# Altium schematic symbol library PCB-Tester-Board.SCHLIB: 118 symbols (part 1 of 2)
Pins are listed as number, name and electrical type; pins without a type are passive.

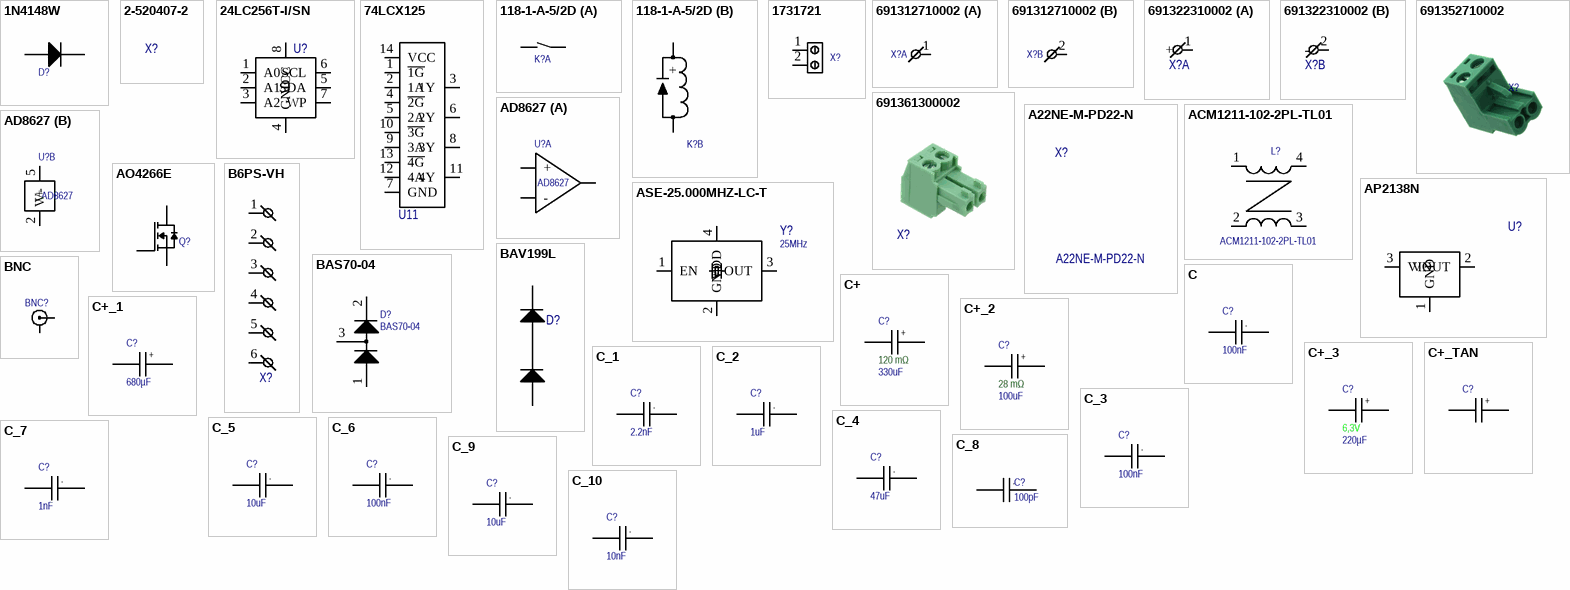
[diagram p0: symbols 1N4148W to C_10]

## 1N4148W
designator D?, comment D  (value not drawn)
DIODE SILICON 100V 2A SOD123; 07. Manufacturer  Part Number: 1N4148W; 11. RoHS: YES; ComponentLink1Description: Info; ComponentLink1URL: https://www.digikey.de/product-detail/en/nexperia-usa-inc/PMEG4050EP115/1727-5842-6-ND/2697559; ComponentLink2Description: DataSheet; ComponentLink2URL: https://assets.nexperia.com/documents/data-sheet/PMEG4050EP.pdf
footprint SOD123
pins: 1 A, 2 C

## 2-520407-2
designator X?, comment X  (value not drawn)
CONN QC RCPT 18-22AWG 0.250; 04. Manufacturer: TE Connectivity AMP Connectors; 07. Manufacturer  Part Number: 2-520407-2; 03. Unit Price: 0.36; 13. Created Date/Name: AUG 2018 / Hören; System: Connector; 01. Distributor: DigiKey; 02. Distributor Part Number: A27854-ND; 11. RoHS: YES; ComponentLink1Description: Info; ComponentLink1URL: https://www.digikey.de/products/de?keywords=2-520407-2; ComponentLink2Description: DataSheet; ComponentLink2URL: https://www.te.com/commerce/DocumentDelivery/DDEController?Action=srchrtrv&DocNm=520407&DocType=Customer+Drawing&DocLang=English

## 24LC256T-I/SN
designator U?, comment U  (value not drawn)
IC EEPROM 256K I2C 400KHZ 8SOIC; 04. Manufacturer: Microchip Technology; 07. Manufacturer  Part Number: 24LC256T-I/SN; 03. Unit Price: 0.71; 13. Created Date/Name: AUG 2018 / Hören; 01. Distributor: DigiKey; 02. Distributor Part Number: 24LC256T-I/SNDKR-ND; 11. RoHS: YES; ComponentLink1Description: Info; ComponentLink1URL: https://www.digikey.de/product-detail/en/microchip-technology/24LC256T-I-SN/24LC256T-I-SNDKR-ND/1850685; ComponentLink2Description: DataSheet; ComponentLink2URL: http://ww1.microchip.com/downloads/en/DeviceDoc/24AA256-24LC256-24FC256-Data-Sheet-20001203W.pdf; Package: SOIC8
footprint SOIC8 (R-8) (Generic 8 lead SOIC Narrow Body)
pins: 1 A0, 2 A1, 3 A2, 4 GND (power), 5 SDA, 6 SCL, 7 WP, 8 VCC (power)

## 74LCX125
designator U11, comment U  (value not drawn)
IC BUF NON-INVERT 3.6V 14TSSOP; 04. Manufacturer: STMicroelectronics; 07. Manufacturer  Part Number: 74LCX125YTTR; 01. Distributor: DigiKey; 02. Distributor Part Number: 497-13204-2-ND; 11. RoHS: YES; ComponentLink1Description: Info; ComponentLink2Description: DataSheet; Package: TSSOP14
footprint TSSOP14 (R-PDSO-G14)
pins: 1 ~{1G}, 2 1A, 3 1Y, 4 ~{2G}, 5 2A, 6 2Y, 7 GND, 8 3Y, 9 3A, 10 ~{3G}, 11 4Y, 12 4A, 13 ~{4G}, 14 VCC

## 118-1-A-5/2D
designator K?, comment K  (value not drawn)
5V Signal Relais, Normal Open; 04. Manufacturer: Pickering; 07. Manufacturer  Part Number: 118-1-A-5/2D; 03. Unit Price: 2.60; 05. Quantity: 1000; 06. Data Sheet: Pickering_series_118.pdf; 13. Created Date/Name: 20.12.17 S. Kaiser; Coil Resistance: 1500 Ohm; Max Carry Current: 1.2 A; Max Switch Current: 1A; Max Switch Voltage: 200V; Power Rating: 15W; 01. Distributor: Pickering; 02. Distributor Part Number: 118-1-A-5/2D; 09. Operating Temperature: -20°C ~ +85°C; 11. RoHS: 2011/65/EU; ComponentLink1Description: Info; ComponentLink1URL: http://www.pickeringrelay.com/; ComponentLink2Description: DataSheet; ComponentLink2URL: https://www.pickeringrelay.com/products/single-line-sil-series-111-119/single-line-sil-series-118/; Coil Voltage: 5V
footprint 118-1A (ATE Relay (NO))
part A pins: 3 CA, 4 CB
part B pins: 1 +, 2 -
1 alternate drawing of the same symbol

## 1731721
designator X?, comment X  (value not drawn)
TERM BLK 2P SIDE ENT 7.62MM PCB; 04. Manufacturer: Phoenix Contact; 07. Manufacturer  Part Number: 1731721; 03. Unit Price: 2.12; 13. Created Date/Name: JAN 2019 / Hören; System: Connector; 01. Distributor: DigiKey; 02. Distributor Part Number: 277-5849-ND; 11. RoHS: YES; ComponentLink1Description: Info; ComponentLink1URL: https://www.digikey.de/products/en?keywords=1731721; ComponentLink2Description: DataSheet; ComponentLink2URL: https://media.digikey.com/pdf/Data%20Sheets/Phoenix%20Contact%20PDFs/1731721.pdf
footprint 1731721 (TERM BLK 2P SIDE ENT 7.62MM PCB)
pins: 1, 2

## 691312710002
designator X?, comment X  (value not drawn)
TERM BLOCK HDR 2POS 90DEG 5MM; 04. Manufacturer: Würth Elektronik; 07. Manufacturer  Part Number: 691312710002; 03. Unit Price: 0.244; 13. Created Date/Name: ??? / Hören; System: Connector; 01. Distributor: DigiKey; 02. Distributor Part Number: 732-2805-ND; ComponentLink1Description: Info; ComponentLink2Description: DataSheet
footprint 691312710002 (TERM BLOCK HDR 2POS 90DEG 5MM)
part A pins: 1 +
part B pins: 2 -

## 691322310002
designator X?, comment X  (value not drawn)
TERM BLOCK HDR 2POS 90DEG 3.81MM; 04. Manufacturer: Würth Elektronik; 07. Manufacturer  Part Number: 691322310002; 03. Unit Price: 0.32; 13. Created Date/Name: ??? / Hören; System: Connector; 01. Distributor: DigiKey; 02. Distributor Part Number: 732-2088-ND; 11. RoHS: YES; ComponentLink1Description: Info; ComponentLink1URL: https://www.digikey.de/products/en?keywords=691322310002; ComponentLink2Description: DataSheet; ComponentLink2URL: https://media.digikey.com/pdf/Data%20Sheets/Wurth%20Electronics%20PDFs/Terminal%20Blocks%20WR-TBL.pdf
footprint 691322310002 (TERM BLOCK HDR 2POS 90DEG 3.81MM)
part A pins: 1 +
part B pins: 2 -

## 691352710002
designator X?, comment X  (value not drawn)
TERM BLOCK PLUG 2POS STR 5MM; 13. Created Date/Name: ??? / Hören; System: Connector; ComponentLink1Description: Info; ComponentLink1URL: https://www.digikey.de/products/en?keywords=691352710002; ComponentLink2Description: DataSheet; ComponentLink2URL: https://www.we-online.de/katalog/datasheet/6913527100xx.pdf
footprint 691352710002 (TERM BLOCK PLUG 2POS STR 5MM)

## 691361300002
designator X?, comment X  (value not drawn)
TERM BLOCK PLUG 2POS STR 3.81MM; 13. Created Date/Name: ??? / Hören; System: Connector; ComponentLink1Description: Info; ComponentLink1URL: https://www.digikey.de/products/en?keywords=691361300002; ComponentLink2Description: DataSheet; ComponentLink2URL: https://media.digikey.com/pdf/Data%20Sheets/Wurth%20Electronics%20PDFs/Terminal%20Blocks%20WR-TBL.pdf
footprint 691361300002 (TERM BLOCK PLUG 2POS STR 3.81MM)

## A22NE-M-PD22-N
designator X?, comment 07. Manufacturer  Part Number: A22NE-M-PD22-N  (hidden comment: X)
E-STOP 40MM 2NO/2NC TURN RESET; 04. Manufacturer: Omron Automation and Safety; 03. Unit Price: 61.54; 13. Created Date/Name: AUG 2018 / Hören; 01. Distributor: DigiKey; 02. Distributor Part Number: 236-A22NE-M-PD22-N-ND; 11. RoHS: YES; ComponentLink1Description: Info; ComponentLink1URL: https://www.digikey.de/products/en?keywords=A22NE-M-PD22-N; ComponentLink2Description: DataSheet; ComponentLink2URL: http://www.ia.omron.com/data_pdf/cat/a22ne-pd_a22ne-p_a22e_a263-e1_20_11_csm1265.pdf

## ACM1211-102-2PL-TL01
designator L?, comment 07. Manufacturer  Part Number: ACM1211-102-2PL-TL01  (hidden comment: L)
CMC 6A 2LN 1 KOHM SMD; 04. Manufacturer: TDK; 03. Unit Price: 0.953; 05. Quantity: 500; 13. Created Date/Name: AUG 2018 / Hören; Type: Power Line; Voltage Rating: 80V; DCR: 14mOhm; 3D-Export: No; 01. Distributor: DigiKey; 02. Distributor Part Number: 445-2213-2-ND; 09. Operating Temperature: -40°C ~ 85°C; 11. RoHS: YES; ComponentLink1Description: Info; ComponentLink1URL: https://www.digikey.de/product-detail/en/tdk-corporation/ACM1211-102-2PL-TL01/445-2213-2-ND/765031; ComponentLink2Description: DataSheet; ComponentLink2URL: https://product.tdk.com/info/en/catalog/datasheets/cmf_commercial_power_acm1211_en.pdf; Current Rating: 6A
footprint ACM1211
pins: 1, 2, 3, 4

## AD8627
designator U?, comment Part: AD8627  (hidden comment: U)
IC OPAMP JFET 5MHZ RRO SC70-5; 04. Manufacturer: Analog Devices Inc.; 07. Manufacturer  Part Number: AD8627AKSZ-R2; 03. Unit Price: 5.15; 13. Created Date/Name: AUG 2018 / Hören; 01. Distributor: DigiKey; 02. Distributor Part Number: AD8627AKSZ-R2DKR-ND; 09. Operating Temperature: -40°C ~ 85°C; 11. RoHS: YES; ComponentLink1Description: Info; ComponentLink1URL: https://www.digikey.de/product-detail/en/analog-devices-inc/AD8627AKSZ-R2/AD8627AKSZ-R2DKR-ND/3878640; ComponentLink2Description: DataSheet; ComponentLink2URL: http://www.analog.com/media/en/technical-documentation/data-sheets/AD8625_8626_8627.pdf; Package: SC70-5
simulation model AD8627 (Model Description)
footprint SC70-5
part A pins: 1 Out, 3 +, 4 -
part B pins: 2 V-, 5 V+

## AO4266E
designator Q?, comment Q  (value not drawn)
MOSFET N-CH 60V 8.5A SO8; 04. Manufacturer: Alpha&Omega; 07. Manufacturer  Part Number: AO4266E; 11. RoHS: YES; ComponentLink1Description: Info; ComponentLink1URL: https://www.digikey.de/product-detail/en/on-semiconductor/FDV303N/FDV303NDKR-ND/1630434; ComponentLink2Description: DataSheet; ComponentLink2URL: https://media.digikey.com/pdf/Data%20Sheets/Fairchild%20PDFs/FDV303N.pdf
footprint SOIC-8_MOSFET (8 lead SOIC with pin numbering for MOSFET)
pins: 1 G, 2 S, 3 D

## AP2138N
designator U?, comment U  (value not drawn)
IC REG LINEAR 1.8V 250MA SOT23-3; 04. Manufacturer: Diodes Incorporated; 07. Manufacturer  Part Number: AP2138N-1.8TRG1; 01. Distributor: DigiKey; 02. Distributor Part Number: AP2138N-1.8TRG1DICT-ND; 11. RoHS: YES; ComponentLink1Description: Info; ComponentLink2Description: DataSheet
footprint SOT23-3
pins: 1 GND, 2 VOUT, 3 VIN

## ASE-25.000MHZ-LC-T
designator Y?, comment Frequency: 25MHz  (hidden comment: Y)
XTAL OSC XO 25.0000MHZ CMOS SMD; 04. Manufacturer: Abracon LLC; 07. Manufacturer  Part Number: ASE-25.000MHZ-LC-T; 03. Unit Price: 1.46; 13. Created Date/Name: AUG 2018 / Hören; 01. Distributor: DigiKey; 02. Distributor Part Number: 535-9568-1-ND; 11. RoHS: YES; ComponentLink1Description: Info; ComponentLink1URL: https://www.digikey.de/products/en?keywords=535-9568-1-ND; ComponentLink2Description: DataSheet; Package: 4SMD
footprint 4SMD
pins: 1 EN, 2 GND, 3 OUT, 4 VDD

## B6PS-VH
designator X?, comment X  (value not drawn)
CONN HEADER R/A 6POS 3.96MM; 04. Manufacturer: JST Sales America Inc.; 07. Manufacturer  Part Number: B6PS-VH(LF)(SN); 03. Unit Price: 0.38; 13. Created Date/Name: AUG 2018 / Hören; System: Connector; 01. Distributor: DigiKey; 02. Distributor Part Number: 455-1652-ND; 09. Operating Temperature: -25°C ~ 85°C; 11. RoHS: YES; ComponentLink1Description: Info; ComponentLink1URL: https://www.digikey.de/product-detail/en/jst-sales-america-inc/B6PS-VH-LF-SN/455-1652-ND/926559; ComponentLink2Description: DataSheet; ComponentLink2URL: http://www.jst-mfg.com/product/pdf/eng/eVH.pdf
footprint B6PS-VH (CONN HEADER R/A 6POS 3.96MM)
footprint B6PS-VH+ (CONN HEADER R/A 6POS 3.96MM + CONNECTOR)
pins: 1, 2, 3, 4, 5, 6

## BAS70-04
designator D?, comment 07. Manufacturer  Part Number: BAS70-04  (hidden comment: D)
DIODE ARRAY SCHOTTKY 70V SOT23-3; 04. Manufacturer: DIODES Inc; 03. Unit Price: 0.22; 05. Quantity: 1; 13. Created Date/Name: AUG 2018 / Hören; ComponentLink1Description: Info; ComponentLink1URL: https://www.digikey.de/products/en?keywords=BAS70-04-FDITR-ND; 01. Distributor: DigiKey; 02. Distributor Part Number: BAS70-04-FDITR-ND; 09. Operating Temperature: -55°C ~ 125°C; 11. RoHS: YES; ComponentLink4Description: DataSheet; ComponentLink4URL: https://www.diodes.com/assets/Datasheets/ds11007.pdf
footprint SOT23-3
pins: 1, 2, 3
1 alternate drawing of the same symbol

## BAV199L
designator D?, comment D  (value not drawn)
DIODE ARRAY GP 70V 215MA SOT23-3; 04. Manufacturer: ON Semiconductor; 07. Manufacturer  Part Number: BAV199LT1G; 03. Unit Price: 0.19; 13. Created Date/Name: AUG 2018 / Hören; NicName: BAV199L; 01. Distributor: DigiKey; 02. Distributor Part Number: BAV199LT1GOSDKR-ND; 09. Operating Temperature: -65°C ~ 150°C; 11. RoHS: YES; ComponentLink1Description: Info; ComponentLink1URL: https://www.digikey.de/product-detail/en/on-semiconductor/BAV199LT1G/BAV199LT1GOSDKR-ND/1831717; ComponentLink2Description: DataSheet; ComponentLink2URL: http://www.onsemi.com/pub/Collateral/BAV199LT1-D.PDF; Package: SOT23-3
footprint SOT23-3
pins: 1 A, 2 C, 3 C/A

## BNC
designator BNC?, comment X  (value not drawn)
BNC Connector; 07. Manufacturer  Part Number: [see model description]; 13. Created Date/Name: AUG 2018 / Hören; ComponentLink1Description: Info; 01. Distributor: DigiKey; ComponentLink2Description: DataSheet; ComponentLink3Description: FootPrint; System: Connector
footprint BNC (112778)
footprint BNC mini (0731000105)
pins: 0, 1

## C
designator C?  value 100nF  (hidden comment: C)
CAP CER 0.1UF 16V X7R 0402; 04. Manufacturer: KEMET; 07. Manufacturer  Part Number: C0402C104J4RACTU; Tolerance: ±5%; 03. Unit Price: 0.45; 13. Created Date/Name: AUG2018/Hören; Voltage Rating: 16V; Type: X7R; ComponentLink1Description: Info; ComponentLink1URL: https://www.digikey.de/product-detail/en/kemet/C0402C104J4RACTU/399-7761-6-ND/3472292; 02. Distributor Part Number: 399-7761-6-ND; 09. Operating Temperature: -55°C ~ 125°C; 11. RoHS: YES; 01. Distributor: DigiKey; ComponentLink2Description: DataSheet; ComponentLink2URL: https://content.kemet.com/datasheets/KEM_C1002_X7R_SMD.pdf; Package: 0402
simulation model CAP (Capacitor)
signal-integrity model Cap
footprint C0201 Reflow (SMT Capacitor 0201 Reflow Soldering)
footprint C0402 Reflow (SMT CAP 0402 Reflow Soldering)
footprint C0603 Reflow (SMT Capacitor 0603 Reflow Soldering)
footprint C0603 Wave (SMT Capacitor 0603 Wave Soldering)
footprint C0805 Reflow (SMT Capacitor 0805 Reflow Soldering)
footprint C0805 Wave (SMT Capacitor 0805 Wave Soldering)
footprint Model Name (Footprint not found)
footprint Model Name (Footprint not found)
footprint C1206 Reflow (SMT Capacitor 1206 Reflow Soldering)
footprint C1206 Wave (SMT Capacitor 1206 Wave Soldering)
footprint C1210 Reflow (SMT Capacitor 1210 Reflow Soldering)
footprint C1210 Wave (SMT Capacitor 1210 Wave Soldering)
footprint C1632 Reflow (SMT Capacitor 1632 Reflow Soldering)
footprint C1632 Wave (SMT Capacitor 1632 Wave Soldering)
footprint C1808 Reflow (SMT Capacitor 1808 Reflow Soldering)
footprint C1808 Wave (SMT Capacitor 1808 Wave Soldering)
footprint C1825 Reflow (SMT Capacitor 1825 Reflow Soldering)
footprint C1825 Wave (SMT Capacitor 1825 Wave Soldering)
footprint C2220 Reflow (SMT Capacitor 2220 Reflow Soldering)
footprint C2220 Wave (SMT Capacitor 2220 Wave Soldering)
footprint C2225 Reflow (SMT Capacitor 2225 Reflow Soldering)
footprint C2225 Wave (SMT Capacitor 2225 Wave Soldering)
pins: 1, 2
text: .

## C+
designator C?  value 330uF  ESR: 120 mΩ  (hidden comment: C+)
CAP ALUM 330UF 20% 50V SMD; 04. Manufacturer: Panasonic Electronic Components; 07. Manufacturer  Part Number: EEE-FT1H331AP; 03. Unit Price: 0.96; 13. Created Date/Name: AUG2018/Hören; 3D-Export: No; ComponentLink1Description: Info; ComponentLink1URL: https://www.digikey.de/product-detail/en/panasonic-electronic-components/EEE-FT1H331AP/PCE5026DKR-ND/2652105; Tolerance: ±20%; Voltage Rating: 50V; 02. Distributor Part Number: PCE5026DKR-ND; 09. Operating Temperature: -55°C ~ 105°C; 11. RoHS: YES; 01. Distributor: DigiKey; ComponentLink2Description: DataSheet; ComponentLink2URL: https://industrial.panasonic.com/cdbs/www-data/pdf/RDE0000/ABA0000C1240.pdf
simulation model CAP (Capacitor)
signal-integrity model Cap
footprint SMD-CAP-ALU-A (Ø3.0mm x 5.4mm)
footprint SMD-CAP-ALU-B (Ø4.0mm x 5.4mm)
footprint SMD-CAP-ALU-C (Ø5.0mm x 5.4mm)
footprint SMD-CAP-ALU-D (Ø6.3mm x 5.4mm)
footprint SMD-CAP-ALU-D8 (Ø6.3mm x 7.7mm)
footprint SMD-CAP-ALU-E (Ø8.0mm x 6.2mm)
footprint SMD-CAP-ALU-F (Ø8.0mm x 10.2mm)
footprint SMD-CAP-ALU-G (Ø10.0mm x 10.2mm)
footprint SMD-CAP-ALU-G13 (Ø10.0mm x 13.5mm)
footprint SMD-CAP-ALU-G17 (Ø10.0mm x 16.5mm)
footprint SMD-CAP-ALU-H16 (Ø12.5mm x 16.5mm)
footprint SMD-CAP-ALU-K16 (Ø18mm x 16.5mm)
pins: 1, 2
text: +

## C+_1
designator C?, comment value 680µF  (hidden comment: C+)
CAP ALUM 680UF 20% 50V SMD; 04. Manufacturer: Panasonic Electronic Components; 07. Manufacturer  Part Number: EEV-FK1H681M; ESR: 73 mΩ; Type: Radial, Can - SMD; 03. Unit Price: 1.69; 13. Created Date/Name: AUG2018/Hören; Lifetime @ Temp: 5000 Hrs @ 105°C; 3D-Export: No; ComponentLink1Description: Info; ComponentLink1URL: https://www.digikey.de/product-detail/en/panasonic-electronic-components/EEV-FK1H681M/PCE3523DKR-ND/1838505; Tolerance: ±20%; Voltage Rating: 50V; 02. Distributor Part Number: PCE3523DKR-ND; 09. Operating Temperature: -55°C ~ 105°C; 11. RoHS: YES; 01. Distributor: DigiKey; ComponentLink2Description: DataSheet; ComponentLink2URL: https://industrial.panasonic.com/cdbs/www-data/pdf/RDE0000/ABA0000C1181.pdf; Package: Ø16 mm x 16.5mm
simulation model CAP (Capacitor)
signal-integrity model Cap
footprint SMD-CAP-ALU-A (Ø3.0mm x 5.4mm)
footprint SMD-CAP-ALU-B (Ø4.0mm x 5.4mm)
footprint SMD-CAP-ALU-C (Ø5.0mm x 5.4mm)
footprint SMD-CAP-ALU-D (Ø6.3mm x 5.4mm)
footprint SMD-CAP-ALU-D8 (Ø6.3mm x 7.7mm)
footprint SMD-CAP-ALU-E (Ø8.0mm x 6.2mm)
footprint SMD-CAP-ALU-F (Ø8.0mm x 10.2mm)
footprint SMD-CAP-ALU-G (Ø10.0mm x 10.2mm)
footprint SMD-CAP-ALU-G13 (Ø10.0mm x 13.5mm)
footprint SMD-CAP-ALU-G17 (Ø10.0mm x 16.5mm)
footprint SMD-CAP-ALU-H16 (Ø12.5mm x 16.5mm)
footprint SMD-CAP-ALU-K16 (Ø18mm x 16.5mm)
footprint SMD-CAP-ALU-J16 (Ø16mm x 16.5mm)
pins: 1, 2
text: +

## C+_2
designator C?, comment value 100uF  ESR: 28 mΩ  (hidden comment: C+)
CAP ALUM POLY HYB 100UF 50V SMD; 04. Manufacturer: Panasonic Electronic Components; 07. Manufacturer  Part Number: EEH-ZA1H101P; Tolerance: ±20%; 03. Unit Price: 2.5; 13. Created Date/Name: AUG2018/Hören; 3D-Export: No; ComponentLink1Description: Info; ComponentLink1URL: https://www.digikey.de/product-detail/en/panasonic-electronic-components/EEH-ZA1H101P/P15442DKR-ND/3088152; Voltage Rating: 50V; 02. Distributor Part Number: P15442DKR-ND; 09. Operating Temperature: -55°C ~ 105°C; 11. RoHS: YES; 01. Distributor: DigiKey; ComponentLink2Description: DataSheet; ComponentLink2URL: https://industrial.panasonic.com/cdbs/www-data/pdf/RDD0000/ABA0000C1221.pdf
simulation model CAP (Capacitor)
signal-integrity model Cap
footprint SMD-CAP-ALU-A (Ø3.0mm x 5.4mm)
footprint SMD-CAP-ALU-B (Ø4.0mm x 5.4mm)
footprint SMD-CAP-ALU-C (Ø5.0mm x 5.4mm)
footprint SMD-CAP-ALU-D (Ø6.3mm x 5.4mm)
footprint SMD-CAP-ALU-D8 (Ø6.3mm x 7.7mm)
footprint SMD-CAP-ALU-E (Ø8.0mm x 6.2mm)
footprint SMD-CAP-ALU-F (Ø8.0mm x 10.2mm)
footprint SMD-CAP-ALU-G (Ø10.0mm x 10.2mm)
footprint SMD-CAP-ALU-G13 (Ø10.0mm x 13.5mm)
footprint SMD-CAP-ALU-G17 (Ø10.0mm x 16.5mm)
footprint SMD-CAP-ALU-H16 (Ø12.5mm x 16.5mm)
footprint SMD-CAP-ALU-K16 (Ø18mm x 16.5mm)
pins: 1, 2
text: +

## C+_3
designator C?, comment value 220µF  Voltage Rating: 6,3V  (hidden comment: C+)
CAP ALUM 220UF 20% 6.3V SMD; 04. Manufacturer: Panasonic Electronic Components; 07. Manufacturer  Part Number: EEE-FC0J221P; ESR: 400 mΩ; Type: Radial, Can - SMD; 03. Unit Price: 0.57; 13. Created Date/Name: AUG2018/Hören; Lifetime @ Temp: 1000 Hrs @ 105°C; 3D-Export: No; ComponentLink1Description: Info; ComponentLink1URL: https://www.digikey.de/product-detail/en/panasonic-electronic-components/EEE-FC0J221P/PCE3985DKR-ND/1806511; Tolerance: ±20%; 02. Distributor Part Number: PCE3985DKR-ND; 09. Operating Temperature: -40°C ~ 105°C; 11. RoHS: YES; 01. Distributor: DigiKey; ComponentLink2Description: DataSheet; ComponentLink2URL: https://industrial.panasonic.com/cdbs/www-data/pdf/RDE0000/ABA0000C1172.pdf; Package: Ø8mm x 6.2mm
simulation model CAP (Capacitor)
signal-integrity model Cap
footprint SMD-CAP-ALU-A (Ø3.0mm x 5.4mm)
footprint SMD-CAP-ALU-B (Ø4.0mm x 5.4mm)
footprint SMD-CAP-ALU-C (Ø5.0mm x 5.4mm)
footprint SMD-CAP-ALU-D (Ø6.3mm x 5.4mm)
footprint SMD-CAP-ALU-D8 (Ø6.3mm x 7.7mm)
footprint SMD-CAP-ALU-E (Ø8.0mm x 6.2mm)
footprint SMD-CAP-ALU-F (Ø8.0mm x 10.2mm)
footprint SMD-CAP-ALU-G (Ø10.0mm x 10.2mm)
footprint SMD-CAP-ALU-G13 (Ø10.0mm x 13.5mm)
footprint SMD-CAP-ALU-G17 (Ø10.0mm x 16.5mm)
footprint SMD-CAP-ALU-H16 (Ø12.5mm x 16.5mm)
footprint SMD-CAP-ALU-K16 (Ø18mm x 16.5mm)
pins: 1, 2
text: +

## C+_TAN
designator C?, comment C+  (value not drawn)
3D-Export: No; ComponentLink1Description: Info; 11. RoHS: YES; 01. Distributor: DigiKey; ComponentLink2Description: DataSheet
footprint CAP_TAN_B (Tantalum capacitor in case B)
pins: 1, 2
text: +

## C_1
designator C?, comment value 2.2nF  (hidden comment: C)
CAP CER 2200PF 50V X7R 0402; 04. Manufacturer: Samsung Electro-Mechanics; 07. Manufacturer  Part Number: CL05B222JB5NNNC; Tolerance: ±5%; 03. Unit Price: 0.09; 13. Created Date/Name: AUG2018/Hören; Voltage Rating: 50V; Type: X7R; ComponentLink1Description: Info; ComponentLink1URL: https://www.digikey.de/product-detail/en/samsung-electro-mechanics/CL05B222JB5NNNC/1276-1532-6-ND/3892046; 02. Distributor Part Number: 1276-1532-6-ND; 09. Operating Temperature: -55°C ~ 125°C; 11. RoHS: YES; 01. Distributor: DigiKey; ComponentLink2Description: DataSheet; Package: 0402
simulation model CAP (Capacitor)
signal-integrity model Cap
footprint C0201 Reflow (SMT Capacitor 0201 Reflow Soldering)
footprint C0402 Reflow (SMT CAP 0402 Reflow Soldering)
footprint C0603 Reflow (SMT Capacitor 0603 Reflow Soldering)
footprint C0603 Wave (SMT Capacitor 0603 Wave Soldering)
footprint C0805 Reflow (SMT Capacitor 0805 Reflow Soldering)
footprint C0805 Wave (SMT Capacitor 0805 Wave Soldering)
footprint Model Name (Footprint not found)
footprint Model Name (Footprint not found)
footprint C1206 Reflow (SMT Capacitor 1206 Reflow Soldering)
footprint C1206 Wave (SMT Capacitor 1206 Wave Soldering)
footprint C1210 Reflow (SMT Capacitor 1210 Reflow Soldering)
footprint C1210 Wave (SMT Capacitor 1210 Wave Soldering)
footprint C1632 Reflow (SMT Capacitor 1632 Reflow Soldering)
footprint C1632 Wave (SMT Capacitor 1632 Wave Soldering)
footprint C1808 Reflow (SMT Capacitor 1808 Reflow Soldering)
footprint C1808 Wave (SMT Capacitor 1808 Wave Soldering)
footprint C1825 Reflow (SMT Capacitor 1825 Reflow Soldering)
footprint C1825 Wave (SMT Capacitor 1825 Wave Soldering)
footprint C2220 Reflow (SMT Capacitor 2220 Reflow Soldering)
footprint C2220 Wave (SMT Capacitor 2220 Wave Soldering)
footprint C2225 Reflow (SMT Capacitor 2225 Reflow Soldering)
footprint C2225 Wave (SMT Capacitor 2225 Wave Soldering)
pins: 1, 2
text: .

## C_2
designator C?, comment value 1uF  (hidden comment: C)
CAP CER 1UF 6.3V X7R 0402; 04. Manufacturer: Murata Electronics; 07. Manufacturer  Part Number: GRM155R70J105KA12J; Tolerance: ±10%; 03. Unit Price: 0.11; 13. Created Date/Name: AUG2018/Hören; Voltage Rating: 6.3V; Type: X7R; ComponentLink1Description: Info; ComponentLink1URL: https://www.digikey.de/product-detail/en/murata-electronics/GRM155R70J105KA12J/490-13339-6-ND/5973468; 02. Distributor Part Number: 490-13339-6-ND; 09. Operating Temperature: -55°C ~ 125°C; 11. RoHS: YES; 01. Distributor: DigiKey; ComponentLink2Description: DataSheet; Package: 0402
simulation model CAP (Capacitor)
signal-integrity model Cap
footprint C0201 Reflow (SMT Capacitor 0201 Reflow Soldering)
footprint C0402 Reflow (SMT CAP 0402 Reflow Soldering)
footprint C0603 Reflow (SMT Capacitor 0603 Reflow Soldering)
footprint C0603 Wave (SMT Capacitor 0603 Wave Soldering)
footprint C0805 Reflow (SMT Capacitor 0805 Reflow Soldering)
footprint C0805 Wave (SMT Capacitor 0805 Wave Soldering)
footprint Model Name (Footprint not found)
footprint Model Name (Footprint not found)
footprint C1206 Reflow (SMT Capacitor 1206 Reflow Soldering)
footprint C1206 Wave (SMT Capacitor 1206 Wave Soldering)
footprint C1210 Reflow (SMT Capacitor 1210 Reflow Soldering)
footprint C1210 Wave (SMT Capacitor 1210 Wave Soldering)
footprint C1632 Reflow (SMT Capacitor 1632 Reflow Soldering)
footprint C1632 Wave (SMT Capacitor 1632 Wave Soldering)
footprint C1808 Reflow (SMT Capacitor 1808 Reflow Soldering)
footprint C1808 Wave (SMT Capacitor 1808 Wave Soldering)
footprint C1825 Reflow (SMT Capacitor 1825 Reflow Soldering)
footprint C1825 Wave (SMT Capacitor 1825 Wave Soldering)
footprint C2220 Reflow (SMT Capacitor 2220 Reflow Soldering)
footprint C2220 Wave (SMT Capacitor 2220 Wave Soldering)
footprint C2225 Reflow (SMT Capacitor 2225 Reflow Soldering)
footprint C2225 Wave (SMT Capacitor 2225 Wave Soldering)
pins: 1, 2
text: .

## C_3
designator C?, comment value 100nF  (hidden comment: C)
Capacitor Unpolarized; Tolerance: ±20%; 13. Created Date/Name: AUG2018/Hören; ComponentLink1Description: Info; ComponentLink1URL: *; 09. Operating Temperature: -xx..+yy°C; 11. RoHS: ???; ComponentLink2Description: DataSheet
simulation model CAP (Capacitor)
signal-integrity model Cap
footprint C0201 Reflow (SMT Capacitor 0201 Reflow Soldering)
footprint C0402 Reflow (SMT CAP 0402 Reflow Soldering)
footprint C0603 Reflow (SMT Capacitor 0603 Reflow Soldering)
footprint C0603 Wave (SMT Capacitor 0603 Wave Soldering)
footprint C0805 Reflow (SMT Capacitor 0805 Reflow Soldering)
footprint C0805 Wave (SMT Capacitor 0805 Wave Soldering)
footprint Model Name (Footprint not found)
footprint Model Name (Footprint not found)
footprint C1206 Reflow (SMT Capacitor 1206 Reflow Soldering)
footprint C1206 Wave (SMT Capacitor 1206 Wave Soldering)
footprint C1210 Reflow (SMT Capacitor 1210 Reflow Soldering)
footprint C1210 Wave (SMT Capacitor 1210 Wave Soldering)
footprint C1632 Reflow (SMT Capacitor 1632 Reflow Soldering)
footprint C1632 Wave (SMT Capacitor 1632 Wave Soldering)
footprint C1808 Reflow (SMT Capacitor 1808 Reflow Soldering)
footprint C1808 Wave (SMT Capacitor 1808 Wave Soldering)
footprint C1825 Reflow (SMT Capacitor 1825 Reflow Soldering)
footprint C1825 Wave (SMT Capacitor 1825 Wave Soldering)
footprint C2220 Reflow (SMT Capacitor 2220 Reflow Soldering)
footprint C2220 Wave (SMT Capacitor 2220 Wave Soldering)
footprint C2225 Reflow (SMT Capacitor 2225 Reflow Soldering)
footprint C2225 Wave (SMT Capacitor 2225 Wave Soldering)
pins: 1, 2
text: .

## C_4
designator C?, comment value 47uF  (hidden comment: C)
CAP CER 47UF 10V X5R 1210; 04. Manufacturer: Samsung Electro-Mechanics; 07. Manufacturer  Part Number: CL32A476MPJNNNE; Tolerance: ±20%; 03. Unit Price: 0.88; 13. Created Date/Name: AUG2018/Hören; Voltage Rating: 10V; Type: X5R; ComponentLink1Description: Info; ComponentLink1URL: *; 02. Distributor Part Number: 1276-3380-6-ND; 09. Operating Temperature: -55°C ~ 85°C; 11. RoHS: YES; 01. Distributor: DigiKey; ComponentLink2Description: DataSheet; Package: 1210
simulation model CAP (Capacitor)
signal-integrity model Cap
footprint C0201 Reflow (SMT Capacitor 0201 Reflow Soldering)
footprint C0402 Reflow (SMT CAP 0402 Reflow Soldering)
footprint C0603 Reflow (SMT Capacitor 0603 Reflow Soldering)
footprint C0603 Wave (SMT Capacitor 0603 Wave Soldering)
footprint C0805 Reflow (SMT Capacitor 0805 Reflow Soldering)
footprint C0805 Wave (SMT Capacitor 0805 Wave Soldering)
footprint Model Name (Footprint not found)
footprint Model Name (Footprint not found)
footprint C1206 Reflow (SMT Capacitor 1206 Reflow Soldering)
footprint C1206 Wave (SMT Capacitor 1206 Wave Soldering)
footprint C1210 Reflow (SMT Capacitor 1210 Reflow Soldering)
footprint C1210 Wave (SMT Capacitor 1210 Wave Soldering)
footprint C1632 Reflow (SMT Capacitor 1632 Reflow Soldering)
footprint C1632 Wave (SMT Capacitor 1632 Wave Soldering)
footprint C1808 Reflow (SMT Capacitor 1808 Reflow Soldering)
footprint C1808 Wave (SMT Capacitor 1808 Wave Soldering)
footprint C1825 Reflow (SMT Capacitor 1825 Reflow Soldering)
footprint C1825 Wave (SMT Capacitor 1825 Wave Soldering)
footprint C2220 Reflow (SMT Capacitor 2220 Reflow Soldering)
footprint C2220 Wave (SMT Capacitor 2220 Wave Soldering)
footprint C2225 Reflow (SMT Capacitor 2225 Reflow Soldering)
footprint C2225 Wave (SMT Capacitor 2225 Wave Soldering)
pins: 1, 2
text: .

## C_5
designator C?, comment value 10uF  (hidden comment: C)
CAP CER 10UF 25V X7R 1206; 04. Manufacturer: TDK Corporation; 07. Manufacturer  Part Number: C3216X7R1E106K160AB; Tolerance: ±10%; 03. Unit Price: 0.66; 13. Created Date/Name: AUG2018/Hören; Voltage Rating: 25V; Type: X7R; ComponentLink1Description: Info; ComponentLink1URL: https://www.digikey.de/products/en?keywords=445-7705-6-ND; 02. Distributor Part Number: 445-7705-6-ND; 09. Operating Temperature: -55°C ~ 125°C; 11. RoHS: YES; 01. Distributor: DigiKey; ComponentLink2Description: DataSheet; Package: 1206
simulation model CAP (Capacitor)
signal-integrity model Cap
footprint C0201 Reflow (SMT Capacitor 0201 Reflow Soldering)
footprint C0402 Reflow (SMT CAP 0402 Reflow Soldering)
footprint C0603 Reflow (SMT Capacitor 0603 Reflow Soldering)
footprint C0603 Wave (SMT Capacitor 0603 Wave Soldering)
footprint C0805 Reflow (SMT Capacitor 0805 Reflow Soldering)
footprint C0805 Wave (SMT Capacitor 0805 Wave Soldering)
footprint Model Name (Footprint not found)
footprint Model Name (Footprint not found)
footprint C1206 Reflow (SMT Capacitor 1206 Reflow Soldering)
footprint C1206 Wave (SMT Capacitor 1206 Wave Soldering)
footprint C1210 Reflow (SMT Capacitor 1210 Reflow Soldering)
footprint C1210 Wave (SMT Capacitor 1210 Wave Soldering)
footprint C1632 Reflow (SMT Capacitor 1632 Reflow Soldering)
footprint C1632 Wave (SMT Capacitor 1632 Wave Soldering)
footprint C1808 Reflow (SMT Capacitor 1808 Reflow Soldering)
footprint C1808 Wave (SMT Capacitor 1808 Wave Soldering)
footprint C1825 Reflow (SMT Capacitor 1825 Reflow Soldering)
footprint C1825 Wave (SMT Capacitor 1825 Wave Soldering)
footprint C2220 Reflow (SMT Capacitor 2220 Reflow Soldering)
footprint C2220 Wave (SMT Capacitor 2220 Wave Soldering)
footprint C2225 Reflow (SMT Capacitor 2225 Reflow Soldering)
footprint C2225 Wave (SMT Capacitor 2225 Wave Soldering)
pins: 1, 2
text: .

## C_6
designator C?, comment value 100nF  (hidden comment: C)
CAP CER 0.1UF 25V X7R 0402; 04. Manufacturer: Yageo; 07. Manufacturer  Part Number: CC0402KRX7R8BB104; Tolerance: ±10%; 03. Unit Price: 0.09; 13. Created Date/Name: AUG2018/Hören; Voltage Rating: 25V; Type: X7R; ComponentLink1Description: Info; ComponentLink1URL: https://www.digikey.de/products/en?keywords=311-2077-6-ND; 02. Distributor Part Number: 311-2077-6-ND; 09. Operating Temperature: -55°C ~ 125°C; 11. RoHS: YES; 01. Distributor: DigiKey; ComponentLink2Description: DataSheet; Package: 0402
simulation model CAP (Capacitor)
signal-integrity model Cap
footprint C0201 Reflow (SMT Capacitor 0201 Reflow Soldering)
footprint C0402 Reflow (SMT CAP 0402 Reflow Soldering)
footprint C0603 Reflow (SMT Capacitor 0603 Reflow Soldering)
footprint C0603 Wave (SMT Capacitor 0603 Wave Soldering)
footprint C0805 Reflow (SMT Capacitor 0805 Reflow Soldering)
footprint C0805 Wave (SMT Capacitor 0805 Wave Soldering)
footprint Model Name (Footprint not found)
footprint Model Name (Footprint not found)
footprint C1206 Reflow (SMT Capacitor 1206 Reflow Soldering)
footprint C1206 Wave (SMT Capacitor 1206 Wave Soldering)
footprint C1210 Reflow (SMT Capacitor 1210 Reflow Soldering)
footprint C1210 Wave (SMT Capacitor 1210 Wave Soldering)
footprint C1632 Reflow (SMT Capacitor 1632 Reflow Soldering)
footprint C1632 Wave (SMT Capacitor 1632 Wave Soldering)
footprint C1808 Reflow (SMT Capacitor 1808 Reflow Soldering)
footprint C1808 Wave (SMT Capacitor 1808 Wave Soldering)
footprint C1825 Reflow (SMT Capacitor 1825 Reflow Soldering)
footprint C1825 Wave (SMT Capacitor 1825 Wave Soldering)
footprint C2220 Reflow (SMT Capacitor 2220 Reflow Soldering)
footprint C2220 Wave (SMT Capacitor 2220 Wave Soldering)
footprint C2225 Reflow (SMT Capacitor 2225 Reflow Soldering)
footprint C2225 Wave (SMT Capacitor 2225 Wave Soldering)
pins: 1, 2
text: .

## C_7
designator C?, comment value 1nF  (hidden comment: C)
CAP CER 1000PF 25V X7R 0402; 04. Manufacturer: KEMET; 07. Manufacturer  Part Number: C0402C102K3RACTU; Tolerance: ±10%; 03. Unit Price: 0.09; 13. Created Date/Name: AUG2018/Hören; Voltage Rating: 25V; Type: X7R; ComponentLink1Description: Info; ComponentLink1URL: https://www.digikey.de/products/en?keywords=399-1031-6-ND; 02. Distributor Part Number: 399-1031-6-ND; 09. Operating Temperature: -55°C ~ 125°C; 11. RoHS: YES; 01. Distributor: DigiKey; ComponentLink2Description: DataSheet; Package: 0402
simulation model CAP (Capacitor)
signal-integrity model Cap
footprint C0201 Reflow (SMT Capacitor 0201 Reflow Soldering)
footprint C0402 Reflow (SMT CAP 0402 Reflow Soldering)
footprint C0603 Reflow (SMT Capacitor 0603 Reflow Soldering)
footprint C0603 Wave (SMT Capacitor 0603 Wave Soldering)
footprint C0805 Reflow (SMT Capacitor 0805 Reflow Soldering)
footprint C0805 Wave (SMT Capacitor 0805 Wave Soldering)
footprint Model Name (Footprint not found)
footprint Model Name (Footprint not found)
footprint C1206 Reflow (SMT Capacitor 1206 Reflow Soldering)
footprint C1206 Wave (SMT Capacitor 1206 Wave Soldering)
footprint C1210 Reflow (SMT Capacitor 1210 Reflow Soldering)
footprint C1210 Wave (SMT Capacitor 1210 Wave Soldering)
footprint C1632 Reflow (SMT Capacitor 1632 Reflow Soldering)
footprint C1632 Wave (SMT Capacitor 1632 Wave Soldering)
footprint C1808 Reflow (SMT Capacitor 1808 Reflow Soldering)
footprint C1808 Wave (SMT Capacitor 1808 Wave Soldering)
footprint C1825 Reflow (SMT Capacitor 1825 Reflow Soldering)
footprint C1825 Wave (SMT Capacitor 1825 Wave Soldering)
footprint C2220 Reflow (SMT Capacitor 2220 Reflow Soldering)
footprint C2220 Wave (SMT Capacitor 2220 Wave Soldering)
footprint C2225 Reflow (SMT Capacitor 2225 Reflow Soldering)
footprint C2225 Wave (SMT Capacitor 2225 Wave Soldering)
pins: 1, 2
text: .

## C_8
designator C?, comment value 100pF  (hidden comment: C)
CAP CER 100PF 25V C0G/NP0 0402; 04. Manufacturer: KEMET; 07. Manufacturer  Part Number: C0402C101J3GACTU; Tolerance: ±5%; Type: C0G, NP0; 03. Unit Price: 0.09; 13. Created Date/Name: AUG2018/Hören; Voltage Rating: 25V; ComponentLink1Description: Info; ComponentLink1URL: https://www.digikey.de/products/en?keywords=399-1022-6-ND; 02. Distributor Part Number: 399-1022-6-ND; 09. Operating Temperature: -55°C ~ 125°C; 11. RoHS: YES; 01. Distributor: DigiKey; ComponentLink2Description: DataSheet; Package: 0402
simulation model CAP (Capacitor)
signal-integrity model Cap
footprint C0201 Reflow (SMT Capacitor 0201 Reflow Soldering)
footprint C0402 Reflow (SMT CAP 0402 Reflow Soldering)
footprint C0603 Reflow (SMT Capacitor 0603 Reflow Soldering)
footprint C0603 Wave (SMT Capacitor 0603 Wave Soldering)
footprint C0805 Reflow (SMT Capacitor 0805 Reflow Soldering)
footprint C0805 Wave (SMT Capacitor 0805 Wave Soldering)
footprint Model Name (Footprint not found)
footprint Model Name (Footprint not found)
footprint C1206 Reflow (SMT Capacitor 1206 Reflow Soldering)
footprint C1206 Wave (SMT Capacitor 1206 Wave Soldering)
footprint C1210 Reflow (SMT Capacitor 1210 Reflow Soldering)
footprint C1210 Wave (SMT Capacitor 1210 Wave Soldering)
footprint C1632 Reflow (SMT Capacitor 1632 Reflow Soldering)
footprint C1632 Wave (SMT Capacitor 1632 Wave Soldering)
footprint C1808 Reflow (SMT Capacitor 1808 Reflow Soldering)
footprint C1808 Wave (SMT Capacitor 1808 Wave Soldering)
footprint C1825 Reflow (SMT Capacitor 1825 Reflow Soldering)
footprint C1825 Wave (SMT Capacitor 1825 Wave Soldering)
footprint C2220 Reflow (SMT Capacitor 2220 Reflow Soldering)
footprint C2220 Wave (SMT Capacitor 2220 Wave Soldering)
footprint C2225 Reflow (SMT Capacitor 2225 Reflow Soldering)
footprint C2225 Wave (SMT Capacitor 2225 Wave Soldering)
pins: 1, 2
text: .

## C_9
designator C?, comment value 10uF  (hidden comment: C)
CAP CER 10UF 10V X7R 0805; 04. Manufacturer: Samsung Electro-Mechanics; 07. Manufacturer  Part Number: CL21B106KPQNNNE; Tolerance: ±10%; 03. Unit Price: 0.24; 13. Created Date/Name: AUG2018/Hören; Voltage Rating: 10V; Type: X7R; ComponentLink1Description: Info; ComponentLink1URL: https://www.digikey.de/products/en?keywords=1276-1764-6-ND; 02. Distributor Part Number: 1276-1764-6-ND; 09. Operating Temperature: -55°C ~ 125°C; 11. RoHS: YES; 01. Distributor: DigiKey; ComponentLink2Description: DataSheet; Package: 0805
simulation model CAP (Capacitor)
signal-integrity model Cap
footprint C0201 Reflow (SMT Capacitor 0201 Reflow Soldering)
footprint C0402 Reflow (SMT CAP 0402 Reflow Soldering)
footprint C0603 Reflow (SMT Capacitor 0603 Reflow Soldering)
footprint C0603 Wave (SMT Capacitor 0603 Wave Soldering)
footprint C0805 Reflow (SMT Capacitor 0805 Reflow Soldering)
footprint C0805 Wave (SMT Capacitor 0805 Wave Soldering)
footprint Model Name (Footprint not found)
footprint Model Name (Footprint not found)
footprint C1206 Reflow (SMT Capacitor 1206 Reflow Soldering)
footprint C1206 Wave (SMT Capacitor 1206 Wave Soldering)
footprint C1210 Reflow (SMT Capacitor 1210 Reflow Soldering)
footprint C1210 Wave (SMT Capacitor 1210 Wave Soldering)
footprint C1632 Reflow (SMT Capacitor 1632 Reflow Soldering)
footprint C1632 Wave (SMT Capacitor 1632 Wave Soldering)
footprint C1808 Reflow (SMT Capacitor 1808 Reflow Soldering)
footprint C1808 Wave (SMT Capacitor 1808 Wave Soldering)
footprint C1825 Reflow (SMT Capacitor 1825 Reflow Soldering)
footprint C1825 Wave (SMT Capacitor 1825 Wave Soldering)
footprint C2220 Reflow (SMT Capacitor 2220 Reflow Soldering)
footprint C2220 Wave (SMT Capacitor 2220 Wave Soldering)
footprint C2225 Reflow (SMT Capacitor 2225 Reflow Soldering)
footprint C2225 Wave (SMT Capacitor 2225 Wave Soldering)
pins: 1, 2
text: .

## C_10
designator C?, comment value 10nF  (hidden comment: C)
CAP CER 0.01UF 25V X7R 0402; Tolerance: ±10%; Voltage Rating: 25V; Type: X7R; ComponentLink1Description: Info; ComponentLink1URL: https://www.digikey.de/products/en?keywords=311-2077-6-ND; 11. RoHS: YES; ComponentLink2Description: DataSheet; Package: 0402
simulation model CAP (Capacitor)
signal-integrity model Cap
footprint C0201 Reflow (SMT Capacitor 0201 Reflow Soldering)
footprint C0402 Reflow (SMT CAP 0402 Reflow Soldering)
footprint C0603 Reflow (SMT Capacitor 0603 Reflow Soldering)
footprint C0603 Wave (SMT Capacitor 0603 Wave Soldering)
footprint C0805 Reflow (SMT Capacitor 0805 Reflow Soldering)
footprint C0805 Wave (SMT Capacitor 0805 Wave Soldering)
footprint Model Name (Footprint not found)
footprint Model Name (Footprint not found)
footprint C1206 Reflow (SMT Capacitor 1206 Reflow Soldering)
footprint C1206 Wave (SMT Capacitor 1206 Wave Soldering)
footprint C1210 Reflow (SMT Capacitor 1210 Reflow Soldering)
footprint C1210 Wave (SMT Capacitor 1210 Wave Soldering)
footprint C1632 Reflow (SMT Capacitor 1632 Reflow Soldering)
footprint C1632 Wave (SMT Capacitor 1632 Wave Soldering)
footprint C1808 Reflow (SMT Capacitor 1808 Reflow Soldering)
footprint C1808 Wave (SMT Capacitor 1808 Wave Soldering)
footprint C1825 Reflow (SMT Capacitor 1825 Reflow Soldering)
footprint C1825 Wave (SMT Capacitor 1825 Wave Soldering)
footprint C2220 Reflow (SMT Capacitor 2220 Reflow Soldering)
footprint C2220 Wave (SMT Capacitor 2220 Wave Soldering)
footprint C2225 Reflow (SMT Capacitor 2225 Reflow Soldering)
footprint C2225 Wave (SMT Capacitor 2225 Wave Soldering)
pins: 1, 2
